# Altium footprint library BRT_Components.PcbLib: 132 footprints (part 3 of 9)
Each footprint in its own frame and in the unit in brackets; x right, y up, seen from the top. Pads: shape width x height; smd on the part's side, far side on the other; paste and mask are expansions set on the pad; w line width, h text height; cw(c..) or ccw(c..) is an arc to the next point about the centre after c.
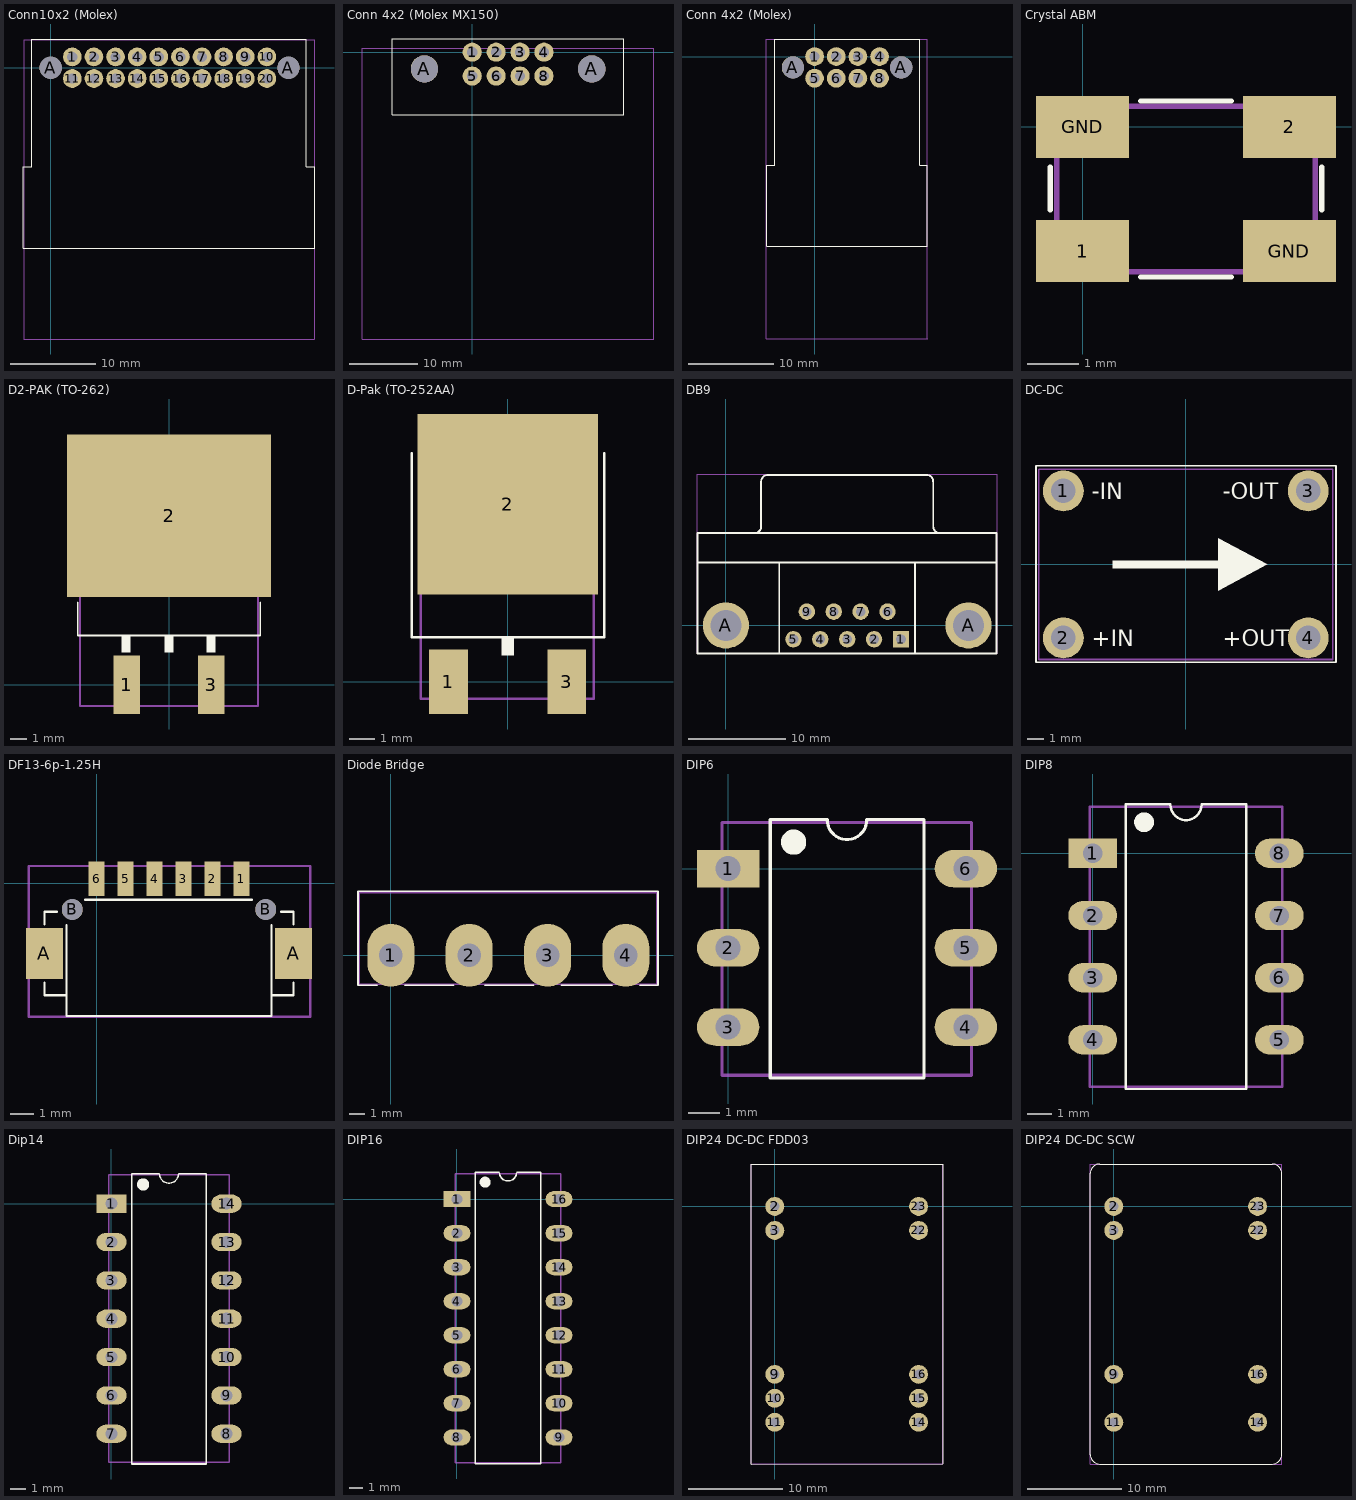
[diagram p2: the footprints below, top view; thin cyan lines are the x and y axes]

## Conn10x2 (Molex) [mm]
pads (22):
  round 2.2 hole 1.2: 1(2.54,1.27) 2(5.08,1.27) 3(7.62,1.27) 4(10.16,1.27) 5(12.7,1.27) 6(15.24,1.27) 7(17.78,1.27) 8(20.32,1.27) 9(22.86,1.27) 10(25.4,1.27) 11(2.54,-1.27) 12(5.08,-1.27) 13(7.62,-1.27) 14(10.16,-1.27) 15(12.7,-1.27) 16(15.24,-1.27) 17(17.78,-1.27) 18(20.32,-1.27) 19(22.86,-1.27) 20(25.4,-1.27)
  round 2.6 hole 2.6 unplated: A(0,0) A(27.94,0)
Top Overlay:
  lines w0.1: -3.25,-21.2 -3.25,-21.2 ; -3.25,-21.2 -3.25,-11.625 -2.25,-11.625 -2.25,3.375 30.05,3.375 30.05,-11.625 31.05,-11.625 31.05,-21.2 -3.25,-21.2
Mechanical 13:
  lines w0.1: -3.15,-31.875 -3.15,3.275 30.95,3.275 30.95,-31.875 -3.15,-31.875
3D body "346910200.stp": height 22.41, standoff -3.15, extent -3.15,-31.863 30.95,3.3

## Conn 4x2 (Molex MX150) [mm]
pads (10):
  round 2.8 hole 1.5: 1(0,0) 2(3.5,0) 3(7,0) 4(10.5,0) 5(0,-3.497) 6(3.5,-3.497) 7(7,-3.497) 8(10.5,-3.497)
  round 4 hole 4: A(-7,-2.46) A(17.5,-2.46)
Top Overlay:
  lines w0.1: -11.68,-9.14 22.195,-9.14 22.195,1.925 -11.68,1.925 -11.68,-9.14
Mechanical 13:
  lines w0.1: -16.11,-42 -16.11,0.54 26.585,0.54 26.585,-42 -16.11,-42
3D body "348300801.stp": height 23.64, standoff -2.85, extent -16.111,-42 26.58,0.56

## Conn 4x2 (Molex) [mm]
pads (10):
  round 2.2 hole 1.2: 1(0,0.002) 2(2.54,0.002) 3(5.08,0.002) 4(7.62,0) 5(-0.004,-2.542) 6(2.536,-2.542) 7(5.075,-2.542) 8(7.615,-2.542)
  round 2.6 hole 2.6: A(-2.54,-1.27) A(10.16,-1.27)
Top Overlay:
  lines w0.1: -5.64,-22.25 -5.64,-12.75 -4.687,-12.75 -4.687,2.06 12.309,2.06 12.309,-12.75 13.22,-12.75 13.22,-22.25 -5.64,-22.25
Mechanical 13:
  lines w0.1: -5.65,-33.125 -5.65,2.05 13.225,2.05 13.225,-33.125 13.25,-33.125 -5.65,-33.125
3D body "346910080.stp": height 22.3, standoff -3.19, extent -5.638,-33.116 13.221,2.047

## Crystal ABM [mm]
pads (4):
  rect 1.8x1.2 smd: 1(0,-2.4) 2(4,0) GND(0,0) GND(4,-2.4)
Top Overlay:
  lines w0.1: -0.625,-1.6 -0.625,-0.775 ; 1.125,-2.9 2.875,-2.9 ; 1.125,0.5 2.875,0.5 ; 4.625,-1.6 4.625,-0.775
Mechanical 13:
  lines w0.1: -0.5,-2.8 4.5,-2.8 4.5,0.4 -0.5,0.4 -0.5,-2.8
3D body "User Library-ABM3B.STEP": height 1.1, standoff 0, extent -0.5,-2.8 4.5,0.4

## D2-PAK (TO-262) [mm]
pads (3):
  rect 1.6x3.5 smd: 1(-2.54,0) 3(2.54,0)
  rect 12.2x9.75 smd: 2(0,10.125)
Top Overlay:
  rectangle: -2.85,1.925 -2.3,2.95
  rectangle: 2.25,1.925 2.8,2.925
  rectangle: -0.275,1.925 0.275,2.925
  lines w0.1: -5.475,4.95 -5.475,2.95 5.475,2.95 5.475,4.95
Mechanical 13:
  lines w0.1: -5.335,-1.272 5.335,-1.272 5.335,13.973 -5.335,13.973 -5.335,-1.272
3D body "User Library-DPAK4P254_1524X483L228X146T686X1067.STEP": height 4.83, standoff 0, extent -5.335,-1.272 5.335,13.973

## D-Pak (TO-252AA) [mm]
pads (3):
  rect 1.5x2.5 smd: 1(-2.3,0) 3(2.3,0)
  rect 7x7 smd: 2(0,6.9)
Top Overlay:
  rectangle: -0.238,1.025 0.238,1.75
  lines w0.1: -3.725,8.875 -3.725,1.725 3.75,1.725 3.75,8.875
Mechanical 13:
  lines w0.1: -3.384,-0.65 3.35,-0.65 3.35,9.45 -3.384,9.45 -3.384,-0.65
3D body "User Library-DPAK_TO-252AA.step": height 2.37, standoff -0.03, extent -3.384,-0.65 3.35,9.45

## DB9 [mm]
pads (11):
  rect 1.69x1.69 hole 1: 1(18.035,-1.42)
  round 1.69 hole 1: 2(15.265,-1.42) 3(12.495,-1.42) 4(9.725,-1.42) 5(6.955,-1.42) 6(16.65,1.42) 7(13.88,1.42) 8(11.11,1.42) 9(8.34,1.42)
  round 4.76 hole 3.2: A(0,0) A(24.99,0)
Top Overlay:
  lines w0.2: -2.905,6.5 27.895,6.5 ; 2.935,9.505 ccw(c2.935,10.2) 3.63,10.2 3.63,14.8 ; 3.635,14.805 cw(c4.33,14.805) 4.33,15.5 20.66,15.5 cw(c20.66,14.805) 21.355,14.805 ; 5.495,-2.9 5.495,6.5 ; 19.495,-2.9 19.495,6.5 ; 21.36,14.8 21.36,10.2 ccw(c22.055,10.2) 22.055,9.505 ; -2.905,-2.9 -2.905,9.5 27.895,9.5 27.895,-2.9 -2.905,-2.9
Mechanical 13:
  lines w0.1: -2.975,-2.85 27.925,-2.85 27.925,15.55 -2.975,15.55 -2.975,-2.85
3D body "DB9.STEP": height 12.53, standoff -3.97, extent -2.975,-2.85 27.925,15.55

## DC-DC [mm]
pads (4):
  round 2.5 / inner round 1.524 / far side round 2.5 hole 1.5: 1(-7.5,4.5) 2(-7.5,-4.5) 3(7.5,4.5) 4(7.5,-4.5)
Top Overlay:
  rectangle: -4.5,-0.25 2,0.25
  region: 2,-1.6 5,0 2,1.6
  lines w0.1: -9.175,-6 -9.175,0.925 -9.175,6.05 9.2,6.05 9.2,-6 -9.175,-6
  text "-IN" at -5.75,4 h1
  text "+IN" at -5.75,-5 h1
  text "+OUT" at 2.25,-5 h1
  text "-OUT" at 2.25,4 h1
Mechanical 13:
  lines w0.1: -9,-5.825 9,-5.825 9,5.825 -9,5.825 -9,-5.825
3D body "dsn-mini-360.step": height 7.3, standoff -4.73, extent -9,-5.825 9,5.825

## DF13-6p-1.25H [mm]
pads (10):
  rect 0.7x1.5 smd: 1(6.25,0.2) 2(5,0.2) 3(3.75,0.2) 4(2.5,0.2) 5(1.25,0.2) 6(0,0.2)
  rect 1.6x2.2 smd: A(-2.25,-3.025) A(8.5,-3.025)
  round 0.9 hole 0.9: B(-1.05,-1.125) B(7.3,-1.125)
Top Overlay:
  lines w0.1: -2.25,-4.275 -2.25,-4.825 -1.3,-4.825 ; -2.25,-1.775 -2.25,-1.225 -1.725,-1.225 ; -1.3,-1.8 -1.3,-5.725 7.55,-5.725 7.55,-1.8 ; -0.5,-0.7 6.7,-0.7 ; 7.55,-4.825 8.5,-4.825 8.5,-4.275 ; 7.975,-1.225 8.5,-1.225 8.5,-1.775
Mechanical 13:
  lines w0.1: -2.925,-5.75 9.225,-5.75 9.225,0.75 -2.925,0.75 -2.925,-5.75
3D body "DF13-6P-1.25H.stp": height 3.58, standoff -0.82, extent -2.925,-5.75 9.225,0.75

## Diode Bridge [mm]
pads (4):
  oval 3x4 hole 1.5: 1(0,0) 2(5,0) 3(10,0) 4(15,0)
Top Overlay:
  lines w0.1: -0.875,-1.925 -2.1,-1.925 -2.1,4.075 17.05,4.075 17.05,-1.925 15.875,-1.925 ; 0.875,-1.925 4,-1.925 ; 6,-1.925 9.125,-1.925 ; 10.875,-1.925 14.125,-1.925
Mechanical 13:
  lines w0.1: -2.025,-1.85 -2.025,4 16.975,4 16.975,-1.85 -2.025,-1.85
3D body "User Library-Silicon Bridge Rectifiers KBL04.step": height 16, standoff -26.4, extent -2.025,-1.85 16.975,4

## DIP6 [mm]
pads (6):
  rect 2x1.2 hole 0.8: 1(0,0)
  oval 2x1.2 hole 0.8: 2(0,-2.54) 3(0,-5.08) 4(7.62,-5.08) 5(7.62,-2.54) 6(7.62,0)
Top Overlay:
  circle w0.6: c2.097,0.85 r0.103
  lines w0.1: 3.175,1.57 ccw(c3.81,1.57) 4.445,1.57 ; 3.175,1.575 1.348,1.575 1.348,-6.715 6.274,-6.715 6.274,1.575 4.445,1.575
Mechanical 13:
  lines w0.1: -0.2,-6.625 7.8,-6.625 7.8,1.475 -0.2,1.475 -0.2,-6.625
3D body "CircuitWorks-DIP6.step": height 4.31, standoff -3.28, extent -0.2,-6.615 7.8,1.465

## DIP8 [mm]
pads (8):
  rect 2x1.2 hole 0.8: 1(0,0)
  oval 2x1.2 hole 0.8: 2(0,-2.54) 3(0,-5.08) 4(0,-7.62) 5(7.62,-7.62) 6(7.62,-5.08) 7(7.62,-2.54) 8(7.62,0)
Top Overlay:
  circle w0.6: c2.097,1.275 r0.103
  lines w0.1: 3.175,1.995 ccw(c3.81,1.995) 4.445,1.995 ; 3.175,2 1.348,2 1.348,-9.625 6.274,-9.625 6.274,2 4.445,2
Mechanical 13:
  lines w0.1: -0.128,-9.525 7.748,-9.525 7.748,1.9 -0.128,1.9 -0.128,-9.525
3D body "DIP8.STEP": height 4.19, standoff -2.67, extent -0.127,-9.525 7.746,1.905

## Dip14 [mm]
pads (14):
  rect 2x1.2 hole 0.8: 1(0,0)
  oval 2x1.2 hole 0.8: 2(0,-2.54) 3(0,-5.08) 4(0,-7.62) 5(0,-10.16) 6(0,-12.7) 7(0,-15.24) 8(7.62,-15.24) 9(7.62,-12.7) 10(7.62,-10.16) 11(7.62,-7.62) 12(7.62,-5.08) 13(7.62,-2.54) 14(7.62,0)
Top Overlay:
  circle w0.6: c2.097,1.275 r0.103
  lines w0.1: 3.175,1.995 ccw(c3.81,1.995) 4.445,1.995 ; 3.175,2 1.348,2 1.348,-17.245 6.274,-17.245 6.274,2 4.445,2
Mechanical 13:
  lines w0.1: -0.19,-17.145 7.81,-17.145 7.81,1.905 -0.19,1.905 -0.19,-17.145
3D body "CircuitWorks-DIP-14.step": height 4.01, standoff -2.97, extent -0.19,-17.145 7.81,1.905

## DIP16 [mm]
pads (16):
  rect 2x1.2 hole 0.8: 1(0,0)
  oval 2x1.2 hole 0.8: 2(0,-2.54) 3(0,-5.08) 4(0,-7.62) 5(0,-10.16) 6(0,-12.7) 7(0,-15.24) 8(0,-17.78) 9(7.62,-17.78) 10(7.62,-15.24) 11(7.62,-12.7) 12(7.62,-10.16) 13(7.62,-7.62) 14(7.62,-5.08) 15(7.62,-2.54) 16(7.62,0)
Top Overlay:
  circle w0.6: c2.097,1.275 r0.103
  lines w0.1: 3.175,1.995 ccw(c3.81,1.995) 4.445,1.995 ; 3.175,2 1.348,2 1.348,-19.775 6.274,-19.775 6.274,2 4.445,2
Mechanical 13:
  lines w0.1: -0.125,-19.675 -0.125,1.9 7.75,1.9 7.75,-19.675 -0.125,-19.675
3D body "CircuitWorks-DIP16.step": height 4.19, standoff -2.57, extent -0.127,-19.685 7.747,1.905

## DIP24 DC-DC FDD03 [mm]
pads (10):
  round 2 hole 1: 2(0,0) 3(0,-2.54) 9(0,-17.8) 10(0,-20.34) 11(0,-22.88) 14(15.24,-22.88) 15(15.24,-20.34) 16(15.24,-17.8) 22(15.24,-2.54) 23(15.24,0)
Top Overlay:
  lines w0.1: -2.5,-27.3 -2.5,4.5 17.8,4.5 17.8,-27.3 -2.5,-27.3
Mechanical 13:
  lines w0.1: -2.5,-27.3 -2.5,4.5 17.8,4.5 17.8,-27.3 -2.5,-27.3
3D body "ten_6-4821n.stp": height 10.2, standoff -4.1, extent -2.5,-27.3 17.8,4.5

## DIP24 DC-DC SCW [mm]
pads (8):
  round 2 hole 1: 2(0,0) 3(0,-2.54) 9(0,-17.8) 11(0,-22.88) 14(15.24,-22.88) 16(15.24,-17.8) 22(15.24,-2.54) 23(15.24,0)
Top Overlay:
  lines w0.1: -2.5,-26.3 ccw(c-1.5,-26.3) -1.5,-27.3 16.8,-27.3 ccw(c16.8,-26.3) 17.8,-26.3 17.8,3.5 ccw(c16.8,3.5) 16.8,4.5 -1.5,4.5 ccw(c-1.5,3.5) -2.5,3.5 -2.5,-26.3
Mechanical 13:
  lines w0.1: -2.5,-27.3 -2.5,4.5 17.8,4.5 17.8,-27.3 -2.5,-27.3
3D body "User Library-SCW05A.step": height 12.31, standoff -3.71, extent -2.5,-27.3 17.8,4.5